# Altium footprint library mastermind.PCBLIB: 1061 footprints (part 49 of 67)
Each footprint in its own frame and in the unit in brackets; x right, y up, seen from the top. Pads: shape width x height; smd on the part's side, far side on the other; paste and mask are expansions set on the pad; w line width, h text height; cw(c..) or ccw(c..) is an arc to the next point about the centre after c.
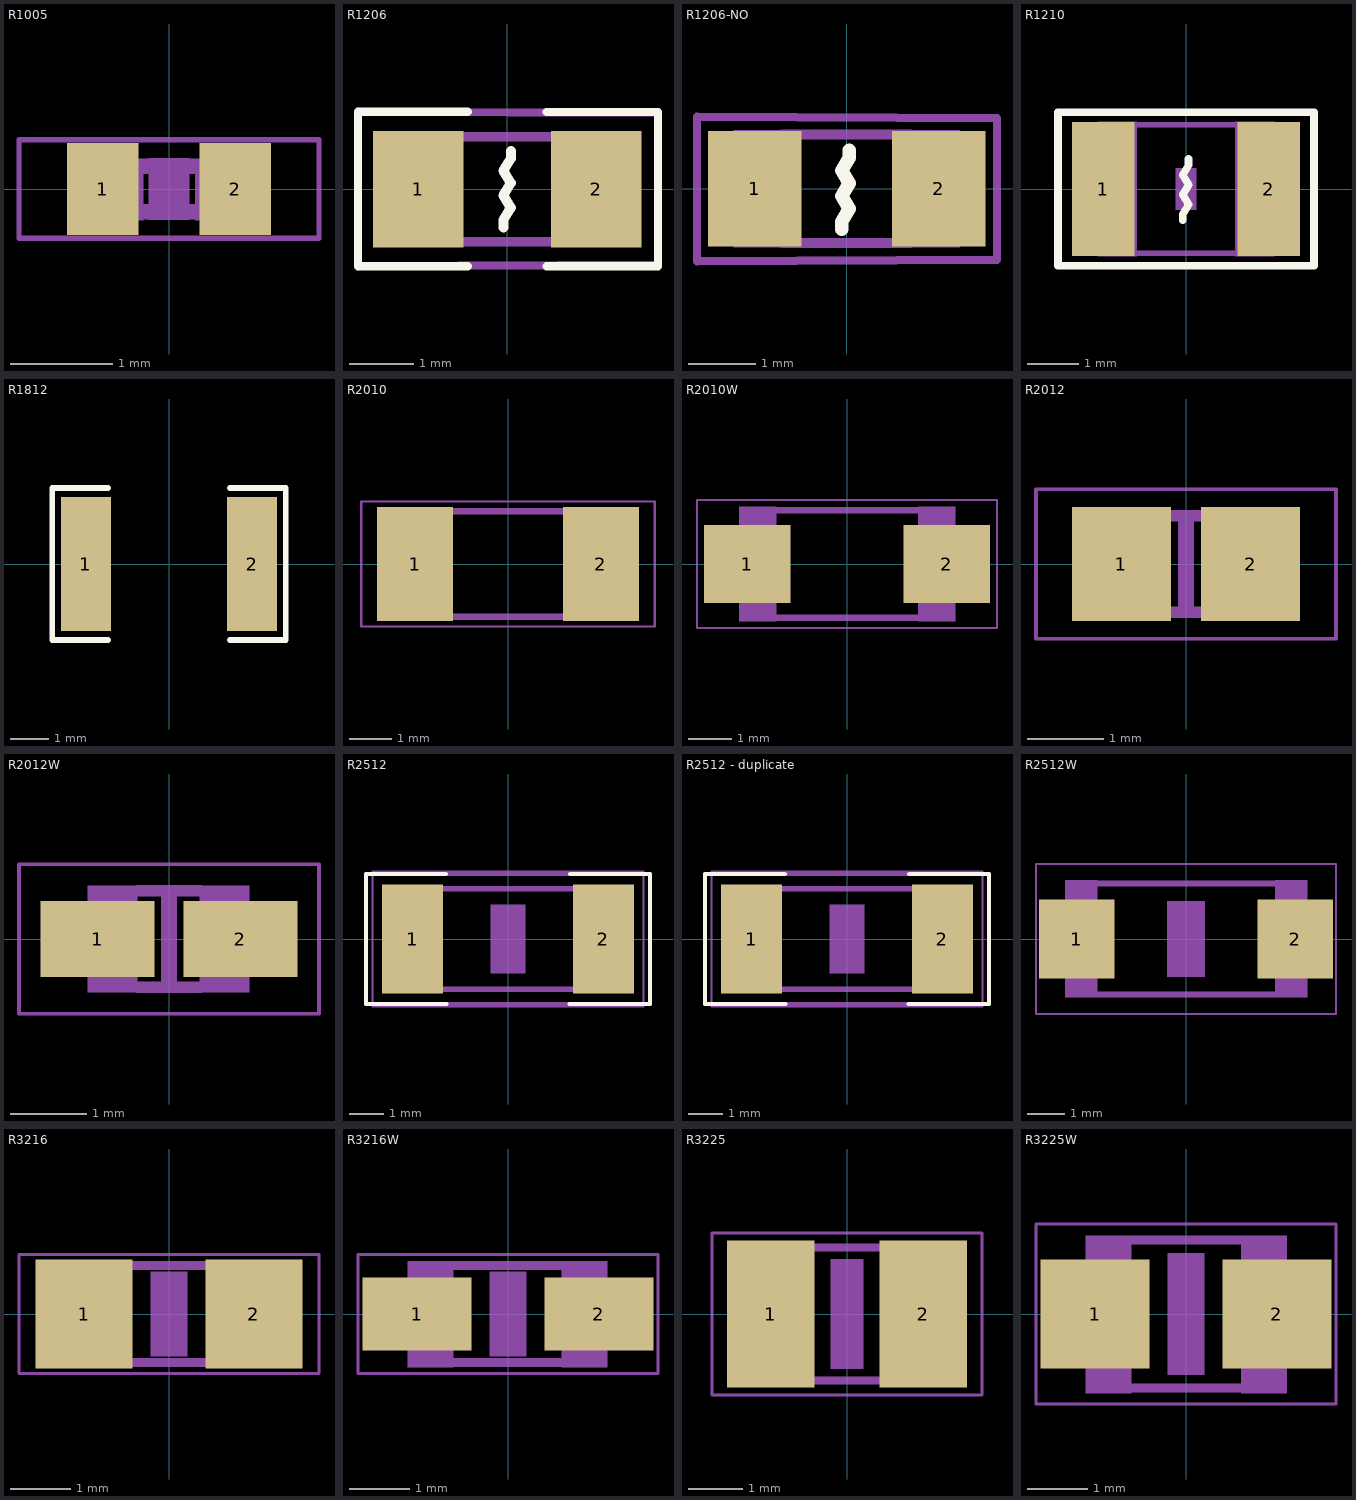
[diagram p48: the footprints below, top view; thin cyan lines are the x and y axes]

## R1005 [mm]
pads (2):
  rect 0.7x0.9 smd: 1(-0.65,0) 2(0.65,0)
Mechanical 8:
  region: -0.554,-0.305 -0.554,0.295 -0.254,0.295 -0.254,-0.305
  region: 0.259,-0.305 0.259,0.295 0.559,0.295 0.559,-0.305
  lines w0.152: -0.245,-0.224 0.245,-0.224 ; -0.245,0.224 0.245,0.224
Mechanical 30:
  region: -0.2,-0.3 -0.2,0.3 0.2,0.3 0.2,-0.3
Mechanical 29 (Mech34):
  lines w0.051: -1.473,-0.483 1.473,-0.483 1.473,0.483 -1.473,0.483 -1.473,-0.483

## R1206 [mm]
pads (2):
  rect 1.4x1.803 smd: 1(-1.376,0) 2(1.376,0)
Top Overlay:
  lines w0.127: -2.308,-1.194 -0.61,-1.194 ; -2.308,-1.18 -2.308,1.2 -0.61,1.2 ; 0.61,-1.194 2.334,-1.194 ; 0.61,1.194 2.334,1.194 ; 2.334,-1.17 2.334,1.18
  lines w0.152: -0.057,-0.591 -0.057,-0.476 0.057,-0.286 -0.057,-0.095 0.057,0.095 -0.057,0.286 0.057,0.476 0.057,0.591
Mechanical 8:
  region: -1.689,-0.876 -1.689,0.876 -0.953,0.876 -0.953,-0.876
  region: 0.953,-0.876 0.953,0.876 1.689,0.876 1.689,-0.876
  lines w0.152: -0.965,-0.813 0.953,-0.813 ; -0.965,0.813 0.953,0.813
Mechanical 29:
  lines w0.127: 2.334,1.18 -2.308,1.2 -2.308,-1.194 2.334,-1.17 2.334,1.194
3D body "Resistor 1206.step": height 0.6, standoff 0, extent -1.906,-0.813 1.894,0.787

## R1206-NO [mm]
height 0.7
pads (2):
  rect 1.4x1.72 smd: 1(-1.376,0) 2(1.376,0)
Top Overlay:
  lines w0.2: -0.075,-0.604 -0.075,-0.49 0.039,-0.299 -0.075,-0.109 0.039,0.082 -0.075,0.272 0.039,0.463 0.039,0.577
Dimensions:
  region: -1.689,-0.876 -1.689,0.876 -0.953,0.876 -0.953,-0.876
  region: 0.953,-0.876 0.953,0.876 1.689,0.876 1.689,-0.876
  lines w0.152: -0.965,-0.813 0.953,-0.813 ; -0.965,0.813 0.953,0.813
  text ".Designator" at 2.076,0.224 h0.61
Mechanical 15:
  lines w0.127: -2.238,-1.082 2.246,-1.06 2.246,1.055 -2.238,1.074 -2.238,-1.082
3D body "Resistor 1206.step": height 0.6, standoff 0, extent -1.906,-0.813 1.894,0.787

## R1210 [mm]
pads (2):
  rect 1.2x2.6 smd: 1(-1.6,0) 2(1.6,0)
Top Overlay:
  lines w0.152: -0.062,-0.604 -0.062,-0.49 0.052,-0.299 -0.062,-0.109 0.052,0.082 -0.062,0.272 0.052,0.463 0.052,0.577 ; -2.473,-1.483 -2.473,1.483 2.473,1.483 2.473,-1.483 -2.473,-1.483
Mechanical 8:
  region: 0.952,-1.305 0.952,1.295 1.702,1.295 1.702,-1.305
  region: -1.702,-1.295 -1.702,1.305 -0.952,1.305 -0.952,-1.295
  lines w0.102: -0.965,-1.245 0.965,-1.245 ; -0.965,1.245 0.965,1.245
Mechanical 30:
  region: -0.2,-0.4 -0.2,0.4 0.2,0.4 0.2,-0.4
3D body "R1210 ERJ14N Thick.step": height 0.6, standoff 0, extent -1.59,-1.25 1.61,1.25

## R1812 [mm]
pads (2):
  rect 1.283x3.456 smd paste-100 mask+0.051: 1(-2.141,0) 2(2.141,0)
Top Overlay:
  lines w0.152: -1.576,-1.957 -3.011,-1.957 -3.011,1.957 -1.576,1.957 ; 1.576,-1.957 3.011,-1.957 3.011,1.957 1.576,1.957
Top Paste:
  region: -1.5,-1.628 -1.5,-0.688 -1.6,-0.588 -1.836,-0.588 -1.936,-0.488 -1.936,0.488 -1.836,0.588 -1.6,0.588 -1.5,0.688 -1.5,1.628 -1.6,1.728 -2.683,1.728 -2.783,1.628 -2.783,-1.628 -2.683,-1.728 -1.6,-1.728
  region: 1.5,-1.628 1.5,-0.688 1.6,-0.588 1.836,-0.588 1.936,-0.488 1.936,0.488 1.836,0.588 1.6,0.588 1.5,0.688 1.5,1.628 1.6,1.728 2.683,1.728 2.783,1.628 2.783,-1.628 2.683,-1.728 1.6,-1.728
3D body "1812_RES.stp": height 0.58, standoff -0.03, extent -2.25,-1.6 2.25,1.6

## R2010 [mm]
pads (2):
  rect 1.8x2.7 smd: 1(-2.2,0) 2(2.2,0)
Mechanical 2:
  lines w0.152: -1.027,1.245 1.027,1.245 ; -1.002,-1.245 1.016,-1.245
Mechanical 8:
  region: -2.489,-1.321 -2.489,1.329 -1.639,1.329 -1.639,-1.321
  region: 1.651,-1.321 1.651,1.329 2.501,1.329 2.501,-1.321
  lines w0.152: -1.662,1.245 1.662,1.245 ; -1.637,-1.245 1.687,-1.245
Mechanical 29 (Mech34):
  lines w0.051: -3.473,-1.483 3.473,-1.483 3.473,1.483 -3.473,1.483 -3.473,-1.483

## R2010W [mm]
pads (2):
  rect 2x1.8 smd: 1(-2.311,0) 2(2.311,0)
Mechanical 2:
  lines w0.152: -1.662,1.245 1.662,1.245 ; -1.637,-1.245 1.687,-1.245
Mechanical 8:
  region: -2.489,-1.321 -2.489,1.329 -1.639,1.329 -1.639,-1.321
  region: 1.651,-1.321 1.651,1.329 2.501,1.329 2.501,-1.321
Mechanical 29 (Mech34):
  lines w0.051: -3.473,-1.483 3.473,-1.483 3.473,1.483 -3.473,1.483 -3.473,-1.483

## R2012 [mm]
pads (2):
  rect 1.3x1.5 smd: 1(-0.85,0) 2(0.85,0)
Mechanical 8:
  region: -1.067,-0.699 -1.067,0.702 -0.417,0.702 -0.417,-0.699
  region: 0.406,-0.699 0.406,0.702 1.056,0.702 1.056,-0.699
  lines w0.152: -0.41,-0.635 0.41,-0.635 ; -0.41,0.635 0.41,0.635
Mechanical 30:
  region: -0.1,-0.6 -0.1,0.6 0.1,0.6 0.1,-0.6
Mechanical 29 (Mech34):
  lines w0.051: -1.973,-0.983 -1.973,0.983 1.973,0.983 1.973,-0.983 -1.973,-0.983

## R2012W [mm]
pads (2):
  rect 1.5x1 smd: 1(-0.94,0) 2(0.94,0)
Mechanical 8:
  region: -1.067,-0.699 -1.067,0.702 -0.417,0.702 -0.417,-0.699
  region: 0.406,-0.699 0.406,0.702 1.056,0.702 1.056,-0.699
  lines w0.152: -0.41,-0.635 0.41,-0.635 ; -0.41,0.635 0.41,0.635
Mechanical 30:
  region: -0.1,-0.6 -0.1,0.6 0.1,0.6 0.1,-0.6
Mechanical 29 (Mech34):
  lines w0.051: -1.973,-0.983 -1.973,0.983 1.973,0.983 1.973,-0.983 -1.973,-0.983

## R2512 [mm]
pads (2):
  rect 1.8x3.2 smd: 1(-2.8,0) 2(2.8,0)
Top Overlay:
  lines w0.127: -4.166,-1.905 -1.803,-1.905 ; -4.166,-1.854 -4.166,1.905 -3.962,1.905 -1.829,1.905 ; 1.803,-1.905 4.166,-1.905 ; 1.829,1.905 4.166,1.905 4.166,-1.854
Mechanical 2:
  lines w0.152: -1.473,-1.473 1.498,-1.473 ; -1.473,1.473 1.498,1.473
Mechanical 8:
  region: -3.2,-1.549 -3.2,1.551 -2.351,1.551 -2.351,-1.549
  region: 2.362,-1.549 2.362,1.551 3.212,1.551 3.212,-1.549
  lines w0.152: -2.362,-1.473 2.387,-1.473 ; -2.362,1.473 2.387,1.473
Mechanical 29:
  lines w0.127: -4.166,-1.905 -4.166,1.905 4.166,1.905 4.166,-1.854 4.166,-1.905 -4.166,-1.905
  text ".Comment" at -2.134,-0.508 h2
Mechanical 30:
  region: -0.5,-1 -0.5,1 0.5,1 0.5,-1
Mechanical 29 (Mech34):
  lines w0.051: -3.973,-1.983 3.973,-1.983 3.973,1.983 -3.973,1.983 -3.973,-1.983
3D body "Resistor 2512.step": height 0.6, standoff 0, extent -3.427,-1.543 3.373,1.557

## R2512 - duplicate [mm]
pads (2):
  rect 1.8x3.2 smd: 1(-2.8,0) 2(2.8,0)
Top Overlay:
  lines w0.127: -4.166,-1.905 -1.803,-1.905 ; -4.166,-1.854 -4.166,1.905 -3.962,1.905 -1.829,1.905 ; 1.803,-1.905 4.166,-1.905 ; 1.829,1.905 4.166,1.905 4.166,-1.854
Mechanical 2:
  lines w0.152: -1.473,-1.473 1.498,-1.473 ; -1.473,1.473 1.498,1.473
Mechanical 8:
  region: -3.2,-1.549 -3.2,1.551 -2.351,1.551 -2.351,-1.549
  region: 2.362,-1.549 2.362,1.551 3.212,1.551 3.212,-1.549
  lines w0.152: -2.362,-1.473 2.387,-1.473 ; -2.362,1.473 2.387,1.473
Mechanical 29:
  lines w0.127: -4.166,-1.905 -4.166,1.905 4.166,1.905 4.166,-1.854 4.166,-1.905 -4.166,-1.905
  text ".Comment" at -2.134,-0.508 h2
Mechanical 30:
  region: -0.5,-1 -0.5,1 0.5,1 0.5,-1
Mechanical 29 (Mech34):
  lines w0.051: -3.973,-1.983 3.973,-1.983 3.973,1.983 -3.973,1.983 -3.973,-1.983
3D body "2512_Fuse.STEP": height 1, standoff 0, extent -3.64,-1.664 3.76,1.736

## R2512W [mm]
pads (2):
  rect 2x2.1 smd: 1(-2.896,0) 2(2.896,0)
Mechanical 2:
  lines w0.152: -2.362,-1.473 2.387,-1.473 ; -2.362,1.473 2.387,1.473
Mechanical 8:
  region: -3.2,-1.549 -3.2,1.551 -2.351,1.551 -2.351,-1.549
  region: 2.362,-1.549 2.362,1.551 3.212,1.551 3.212,-1.549
Mechanical 30:
  region: -0.5,-1 -0.5,1 0.5,1 0.5,-1
Mechanical 29 (Mech34):
  lines w0.051: -3.973,-1.983 3.973,-1.983 3.973,1.983 -3.973,1.983 -3.973,-1.983

## R3216 [mm]
pads (2):
  rect 1.6x1.8 smd: 1(-1.4,0) 2(1.4,0)
Mechanical 8:
  region: -1.651,-0.876 -1.651,0.874 -0.901,0.874 -0.901,-0.876
  region: 0.889,-0.876 0.889,0.874 1.639,0.874 1.639,-0.876
  lines w0.152: -0.913,-0.8 0.888,-0.8 ; -0.913,0.8 0.888,0.8
Mechanical 30:
  region: -0.3,-0.7 -0.3,0.7 0.3,0.7 0.3,-0.7
Mechanical 29 (Mech34):
  lines w0.051: -2.473,-0.983 2.473,-0.983 2.473,0.983 -2.473,0.983 -2.473,-0.983

## R3216W [mm]
pads (2):
  rect 1.8x1.2 smd: 1(-1.499,0) 2(1.499,0)
Mechanical 2:
  lines w0.152: -0.913,-0.8 0.888,-0.8 ; -0.913,0.8 0.888,0.8
Mechanical 8:
  region: 0.889,-0.876 0.889,0.874 1.639,0.874 1.639,-0.876
  region: -1.651,-0.876 -1.651,0.874 -0.901,0.874 -0.901,-0.876
Mechanical 30:
  region: -0.3,-0.7 -0.3,0.7 0.3,0.7 0.3,-0.7
Mechanical 29 (Mech34):
  lines w0.051: -2.473,-0.983 -2.473,0.983 2.473,0.983 2.473,-0.983 -2.473,-0.983

## R3225 [mm]
pads (2):
  rect 1.6x2.7 smd: 1(-1.4,0) 2(1.4,0)
Mechanical 8:
  region: -1.651,-1.308 -1.651,1.292 -0.901,1.292 -0.901,-1.308
  region: 0.914,-1.308 0.914,1.292 1.664,1.292 1.664,-1.308
  lines w0.152: -0.913,-1.219 0.939,-1.219 ; -0.913,1.219 0.939,1.219
Mechanical 30:
  region: -0.3,-1 -0.3,1 0.3,1 0.3,-1
Mechanical 29 (Mech34):
  lines w0.051: -2.473,-1.483 2.473,-1.483 2.473,1.483 -2.473,1.483 -2.473,-1.483

## R3225W [mm]
pads (2):
  rect 1.8x1.8 smd: 1(-1.499,0) 2(1.499,0)
Mechanical 2:
  lines w0.152: -0.913,-1.219 0.939,-1.219 ; -0.913,1.219 0.939,1.219
Mechanical 8:
  region: 0.914,-1.308 0.914,1.292 1.664,1.292 1.664,-1.308
  region: -1.651,-1.308 -1.651,1.292 -0.901,1.292 -0.901,-1.308
Mechanical 30:
  region: -0.3,-1 -0.3,1 0.3,1 0.3,-1
Mechanical 29 (Mech34):
  lines w0.051: -2.473,-1.483 -2.473,1.483 2.473,1.483 2.473,-1.483 -2.473,-1.483